# Altium schematic symbol library jlcpcb_2025_04_inductors_extended_0805.schlib: 882 symbols (part 5 of 5) (continued)
## VHF201209H2N2ST
designator L?  Inductance: 2.2nH
Inductor, 2.2nH, 100mΩ, 600mA, SMD 0805; Manufacturer: FH(Guangdong Fenghua Advanced Tech); Manufacturer Part Number: VHF201209H2N2ST; Package Size: 0805; JLCPCB Basic Part: No; JLCPCB Part Number: C1037; Supplier 1: LCSC; Category: Inductors; Supplier Part Number 1: C1037; Rated Current: 600mA; DC Resistance: 100mΩ; RoHS: Yes; ComponentLink1Description: Datasheet; ComponentLink1URL: https://wmsc.lcsc.com/wmsc/upload/file/pdf/v2/lcsc/2302231101_FH--Guangdong-Fenghua-Advanced-Tech-VHF201209H2N2ST_C1037.pdf; ComponentLink2Description: JLCPCB Part URL; ComponentLink2URL: https://jlcpcb.com/partdetail/C1037; ComponentLink3Description: LCSC Part URL; ComponentLink3URL: https://lcsc.com/product-detail/Inductors-SMD_FH-Guangdong-Fenghua-Advanced-Tech-FH-Guangdong-Fenghua-Advanced-Tech-VHF201209H2N2ST_C1037.html
footprint IND-0805 (0805 (2012M) Inductor)
pins: 1, 2

## VHF201209H2N7S
designator L?  Inductance: 2.7nH
Inductor, 2.7nH, 100mΩ, 600mA, SMD 0805; Manufacturer: FH(Guangdong Fenghua Advanced Tech); Manufacturer Part Number: VHF201209H2N7S; Package Size: 0805; JLCPCB Basic Part: No; JLCPCB Part Number: C98981; Supplier 1: LCSC; Category: Inductors; Supplier Part Number 1: C98981; Rated Current: 600mA; DC Resistance: 100mΩ; RoHS: Yes; ComponentLink1Description: Datasheet; ComponentLink1URL: https://wmsc.lcsc.com/wmsc/upload/file/pdf/v2/lcsc/2304140030_FH--Guangdong-Fenghua-Advanced-Tech-VHF201209H2N7S_C98981.pdf; ComponentLink2Description: JLCPCB Part URL; ComponentLink2URL: https://jlcpcb.com/partdetail/C98981; ComponentLink3Description: LCSC Part URL; ComponentLink3URL: https://lcsc.com/product-detail/Inductors-SMD_FH-Guangdong-Fenghua-Advanced-Tech-FH-Guangdong-Fenghua-Advanced-Tech-VHF201209H2N7S_C98981.html
footprint IND-0805 (0805 (2012M) Inductor)
pins: 1, 2

## VHF201209H2N7ST
designator L?  Inductance: 2.7nH
Inductor, 2.7nH, 100mΩ, 600mA, SMD 0805; Manufacturer: FH(Guangdong Fenghua Advanced Tech); Manufacturer Part Number: VHF201209H2N7ST; Package Size: 0805; JLCPCB Basic Part: No; JLCPCB Part Number: C381905; Supplier 1: LCSC; Category: Inductors; Supplier Part Number 1: C381905; Rated Current: 600mA; DC Resistance: 100mΩ; RoHS: Yes; ComponentLink1Description: Datasheet; ComponentLink1URL: https://wmsc.lcsc.com/wmsc/upload/file/pdf/v2/lcsc/2302231208_FH--Guangdong-Fenghua-Advanced-Tech-VHF201209H2N7ST_C381905.pdf; ComponentLink2Description: JLCPCB Part URL; ComponentLink2URL: https://jlcpcb.com/partdetail/C381905; ComponentLink3Description: LCSC Part URL; ComponentLink3URL: https://lcsc.com/product-detail/Inductors-SMD_FH-Guangdong-Fenghua-Advanced-Tech-FH-Guangdong-Fenghua-Advanced-Tech-VHF201209H2N7ST_C381905.html
footprint IND-0805 (0805 (2012M) Inductor)
pins: 1, 2

## VHF201209H3N3ST
designator L?  Inductance: 3.3nH
Inductor, 3.3nH, 130mΩ, 600mA, SMD 0805; Manufacturer: FH(Guangdong Fenghua Advanced Tech); Manufacturer Part Number: VHF201209H3N3ST; Package Size: 0805; JLCPCB Basic Part: No; JLCPCB Part Number: C98982; Supplier 1: LCSC; Category: Inductors; Supplier Part Number 1: C98982; Rated Current: 600mA; DC Resistance: 130mΩ; RoHS: Yes; ComponentLink1Description: Datasheet; ComponentLink1URL: https://wmsc.lcsc.com/wmsc/upload/file/pdf/v2/lcsc/2302231230_FH--Guangdong-Fenghua-Advanced-Tech-VHF201209H3N3ST_C98982.pdf; ComponentLink2Description: JLCPCB Part URL; ComponentLink2URL: https://jlcpcb.com/partdetail/C98982; ComponentLink3Description: LCSC Part URL; ComponentLink3URL: https://lcsc.com/product-detail/Inductors-SMD_FH-Guangdong-Fenghua-Advanced-Tech-FH-Guangdong-Fenghua-Advanced-Tech-VHF201209H3N3ST_C98982.html
footprint IND-0805 (0805 (2012M) Inductor)
pins: 1, 2

## VHF201209H3N9ST
designator L?  Inductance: 3.9nH
Inductor, 3.9nH, 150mΩ, 600mA, SMD 0805; Manufacturer: FH(Guangdong Fenghua Advanced Tech); Manufacturer Part Number: VHF201209H3N9ST; Package Size: 0805; JLCPCB Basic Part: No; JLCPCB Part Number: C381907; Supplier 1: LCSC; Category: Inductors; Supplier Part Number 1: C381907; Rated Current: 600mA; DC Resistance: 150mΩ; RoHS: Yes; ComponentLink1Description: Datasheet; ComponentLink1URL: https://wmsc.lcsc.com/wmsc/upload/file/pdf/v2/lcsc/2302231208_FH--Guangdong-Fenghua-Advanced-Tech-VHF201209H3N9ST_C381907.pdf; ComponentLink2Description: JLCPCB Part URL; ComponentLink2URL: https://jlcpcb.com/partdetail/C381907; ComponentLink3Description: LCSC Part URL; ComponentLink3URL: https://lcsc.com/product-detail/Inductors-SMD_FH-Guangdong-Fenghua-Advanced-Tech-FH-Guangdong-Fenghua-Advanced-Tech-VHF201209H3N9ST_C381907.html
footprint IND-0805 (0805 (2012M) Inductor)
pins: 1, 2

## VHF201209H4N7ST
designator L?  Inductance: 4.7nH
Inductor, 4.7nH, 200mΩ, 400mA, SMD 0805; Manufacturer: FH(Guangdong Fenghua Advanced Tech); Manufacturer Part Number: VHF201209H4N7ST; Package Size: 0805; JLCPCB Basic Part: No; JLCPCB Part Number: C1039; Supplier 1: LCSC; Category: Inductors; Supplier Part Number 1: C1039; Rated Current: 400mA; DC Resistance: 200mΩ; RoHS: Yes; ComponentLink1Description: Datasheet; ComponentLink1URL: https://wmsc.lcsc.com/wmsc/upload/file/pdf/v2/lcsc/2302231101_FH--Guangdong-Fenghua-Advanced-Tech-VHF201209H4N7ST_C1039.pdf; ComponentLink2Description: JLCPCB Part URL; ComponentLink2URL: https://jlcpcb.com/partdetail/C1039; ComponentLink3Description: LCSC Part URL; ComponentLink3URL: https://lcsc.com/product-detail/Inductors-SMD_FH-Guangdong-Fenghua-Advanced-Tech-FH-Guangdong-Fenghua-Advanced-Tech-VHF201209H4N7ST_C1039.html
footprint IND-0805 (0805 (2012M) Inductor)
pins: 1, 2

## VHF201209H5N1ST
designator L?  Inductance: 5.1nH
Inductor, 5.1nH, SMD 0805; Manufacturer: FH (Guangdong Fenghua Advanced Tech); Manufacturer Part Number: VHF201209H5N1ST; Package Size: 0805; JLCPCB Basic Part: No; JLCPCB Part Number: C3032775; Supplier 1: LCSC; Category: Inductors; Supplier Part Number 1: C3032775; RoHS: Yes; ComponentLink1Description: Datasheet; ComponentLink1URL: https://wmsc.lcsc.com/wmsc/upload/file/pdf/v2/lcsc/2302231130_FH--Guangdong-Fenghua-Advanced-Tech-VHF201209H5N1ST_C3032775.pdf; ComponentLink2Description: JLCPCB Part URL; ComponentLink2URL: https://jlcpcb.com/partdetail/C3032775; ComponentLink3Description: LCSC Part URL; ComponentLink3URL: https://lcsc.com/product-detail/Inductors-SMD_FH-Guangdong-Fenghua-Advanced-Tech-FH-Guangdong-Fenghua-Advanced-Tech-VHF201209H5N1ST_C3032775.html
footprint IND-0805 (0805 (2012M) Inductor)
pins: 1, 2

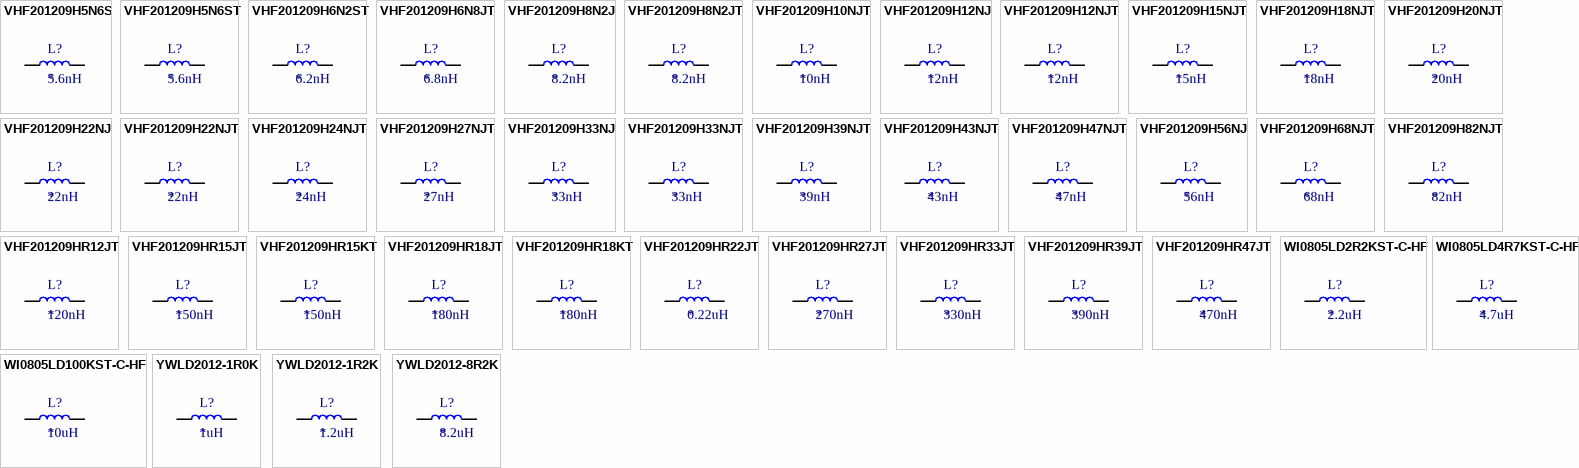
[diagram p21: symbols VHF201209H5N6S to YWLD2012-8R2K]

## VHF201209H5N6S
designator L?  Inductance: 5.6nH
Inductor, 5.6nH, 230mΩ, 400mA, SMD 0805; Manufacturer: FH(Guangdong Fenghua Advanced Tech); Manufacturer Part Number: VHF201209H5N6S; Package Size: 0805; JLCPCB Basic Part: No; JLCPCB Part Number: C98984; Supplier 1: LCSC; Category: Inductors; Supplier Part Number 1: C98984; Rated Current: 400mA; DC Resistance: 230mΩ; RoHS: Yes; ComponentLink1Description: Datasheet; ComponentLink1URL: https://wmsc.lcsc.com/wmsc/upload/file/pdf/v2/lcsc/2304140030_FH--Guangdong-Fenghua-Advanced-Tech-VHF201209H5N6S_C98984.pdf; ComponentLink2Description: JLCPCB Part URL; ComponentLink2URL: https://jlcpcb.com/partdetail/C98984; ComponentLink3Description: LCSC Part URL; ComponentLink3URL: https://lcsc.com/product-detail/Inductors-SMD_FH-Guangdong-Fenghua-Advanced-Tech-FH-Guangdong-Fenghua-Advanced-Tech-VHF201209H5N6S_C98984.html
footprint IND-0805 (0805 (2012M) Inductor)
pins: 1, 2

## VHF201209H5N6ST
designator L?  Inductance: 5.6nH
Inductor, 5.6nH, 230mΩ, 400mA, SMD 0805; Manufacturer: FH(Guangdong Fenghua Advanced Tech); Manufacturer Part Number: VHF201209H5N6ST; Package Size: 0805; JLCPCB Basic Part: No; JLCPCB Part Number: C381908; Supplier 1: LCSC; Category: Inductors; Supplier Part Number 1: C381908; Rated Current: 400mA; DC Resistance: 230mΩ; RoHS: Yes; ComponentLink1Description: Datasheet; ComponentLink1URL: https://wmsc.lcsc.com/wmsc/upload/file/pdf/v2/lcsc/2302231208_FH--Guangdong-Fenghua-Advanced-Tech-VHF201209H5N6ST_C381908.pdf; ComponentLink2Description: JLCPCB Part URL; ComponentLink2URL: https://jlcpcb.com/partdetail/C381908; ComponentLink3Description: LCSC Part URL; ComponentLink3URL: https://lcsc.com/product-detail/Inductors-SMD_FH-Guangdong-Fenghua-Advanced-Tech-FH-Guangdong-Fenghua-Advanced-Tech-VHF201209H5N6ST_C381908.html
footprint IND-0805 (0805 (2012M) Inductor)
pins: 1, 2

## VHF201209H6N2ST
designator L?  Inductance: 6.2nH
Inductor, 6.2nH, 400mA, SMD 0805; Manufacturer: FH (Guangdong Fenghua Advanced Tech); Manufacturer Part Number: VHF201209H6N2ST; Package Size: 0805; JLCPCB Basic Part: No; JLCPCB Part Number: C395101; Supplier 1: LCSC; Category: Inductors; Supplier Part Number 1: C395101; Rated Current: 400mA; RoHS: Yes; ComponentLink1Description: Datasheet; ComponentLink1URL: https://wmsc.lcsc.com/wmsc/upload/file/pdf/v2/lcsc/2302231208_FH--Guangdong-Fenghua-Advanced-Tech-VHF201209H6N2ST_C395101.pdf; ComponentLink2Description: JLCPCB Part URL; ComponentLink2URL: https://jlcpcb.com/partdetail/C395101; ComponentLink3Description: LCSC Part URL; ComponentLink3URL: https://lcsc.com/product-detail/Inductors-SMD_FH-Guangdong-Fenghua-Advanced-Tech-FH-Guangdong-Fenghua-Advanced-Tech-VHF201209H6N2ST_C395101.html
footprint IND-0805 (0805 (2012M) Inductor)
pins: 1, 2

## VHF201209H6N8JT
designator L?  Inductance: 6.8nH
Inductor, 6.8nH, ±5%, 250mΩ, 400mA, SMD 0805; Manufacturer: FH(Guangdong Fenghua Advanced Tech); Manufacturer Part Number: VHF201209H6N8JT; Package Size: 0805; JLCPCB Basic Part: No; JLCPCB Part Number: C98985; Supplier 1: LCSC; Category: Inductors; Supplier Part Number 1: C98985; Tolerance: ±5%; Rated Current: 400mA; DC Resistance: 250mΩ; RoHS: Yes; ComponentLink1Description: Datasheet; ComponentLink1URL: https://wmsc.lcsc.com/wmsc/upload/file/pdf/v2/lcsc/2302231230_FH--Guangdong-Fenghua-Advanced-Tech-VHF201209H6N8JT_C98985.pdf; ComponentLink2Description: JLCPCB Part URL; ComponentLink2URL: https://jlcpcb.com/partdetail/C98985; ComponentLink3Description: LCSC Part URL; ComponentLink3URL: https://lcsc.com/product-detail/Inductors-SMD_FH-Guangdong-Fenghua-Advanced-Tech-FH-Guangdong-Fenghua-Advanced-Tech-VHF201209H6N8JT_C98985.html
footprint IND-0805 (0805 (2012M) Inductor)
pins: 1, 2

## VHF201209H8N2J
designator L?  Inductance: 8.2nH
Inductor, 8.2nH, ±5%, 280mΩ, 400mA, SMD 0805; Manufacturer: FH(Guangdong Fenghua Advanced Tech); Manufacturer Part Number: VHF201209H8N2J; Package Size: 0805; JLCPCB Basic Part: No; JLCPCB Part Number: C98986; Supplier 1: LCSC; Category: Inductors; Supplier Part Number 1: C98986; Tolerance: ±5%; Rated Current: 400mA; DC Resistance: 280mΩ; RoHS: Yes; ComponentLink1Description: Datasheet; ComponentLink1URL: https://wmsc.lcsc.com/wmsc/upload/file/pdf/v2/lcsc/2304140030_FH--Guangdong-Fenghua-Advanced-Tech-VHF201209H8N2J_C98986.pdf; ComponentLink2Description: JLCPCB Part URL; ComponentLink2URL: https://jlcpcb.com/partdetail/C98986; ComponentLink3Description: LCSC Part URL; ComponentLink3URL: https://lcsc.com/product-detail/Inductors-SMD_FH-Guangdong-Fenghua-Advanced-Tech-FH-Guangdong-Fenghua-Advanced-Tech-VHF201209H8N2J_C98986.html
footprint IND-0805 (0805 (2012M) Inductor)
pins: 1, 2

## VHF201209H8N2JT
designator L?  Inductance: 8.2nH
Inductor, 8.2nH, ±5%, 280mΩ, 400mA, SMD 0805; Manufacturer: FH(Guangdong Fenghua Advanced Tech); Manufacturer Part Number: VHF201209H8N2JT; Package Size: 0805; JLCPCB Basic Part: No; JLCPCB Part Number: C1041; Supplier 1: LCSC; Category: Inductors; Supplier Part Number 1: C1041; Tolerance: ±5%; Rated Current: 400mA; DC Resistance: 280mΩ; RoHS: Yes; ComponentLink1Description: Datasheet; ComponentLink1URL: https://wmsc.lcsc.com/wmsc/upload/file/pdf/v2/lcsc/2302231101_FH--Guangdong-Fenghua-Advanced-Tech-VHF201209H8N2JT_C1041.pdf; ComponentLink2Description: JLCPCB Part URL; ComponentLink2URL: https://jlcpcb.com/partdetail/C1041; ComponentLink3Description: LCSC Part URL; ComponentLink3URL: https://lcsc.com/product-detail/Inductors-SMD_FH-Guangdong-Fenghua-Advanced-Tech-FH-Guangdong-Fenghua-Advanced-Tech-VHF201209H8N2JT_C1041.html
footprint IND-0805 (0805 (2012M) Inductor)
pins: 1, 2

## VHF201209H10NJT
designator L?  Inductance: 10nH
Inductor, 10nH, ±5%, 300mΩ, 300mA, SMD 0805; Manufacturer: FH(Guangdong Fenghua Advanced Tech); Manufacturer Part Number: VHF201209H10NJT; Package Size: 0805; JLCPCB Basic Part: No; JLCPCB Part Number: C98987; Supplier 1: LCSC; Category: Inductors; Supplier Part Number 1: C98987; Tolerance: ±5%; Rated Current: 300mA; DC Resistance: 300mΩ; RoHS: Yes; ComponentLink1Description: Datasheet; ComponentLink1URL: https://wmsc.lcsc.com/wmsc/upload/file/pdf/v2/lcsc/2302231230_FH--Guangdong-Fenghua-Advanced-Tech-VHF201209H10NJT_C98987.pdf; ComponentLink2Description: JLCPCB Part URL; ComponentLink2URL: https://jlcpcb.com/partdetail/C98987; ComponentLink3Description: LCSC Part URL; ComponentLink3URL: https://lcsc.com/product-detail/Inductors-SMD_FH-Guangdong-Fenghua-Advanced-Tech-FH-Guangdong-Fenghua-Advanced-Tech-VHF201209H10NJT_C98987.html
footprint IND-0805 (0805 (2012M) Inductor)
pins: 1, 2

## VHF201209H12NJ
designator L?  Inductance: 12nH
Inductor, 12nH, ±5%, 350mΩ, 300mA, SMD 0805; Manufacturer: FH(Guangdong Fenghua Advanced Tech); Manufacturer Part Number: VHF201209H12NJ; Package Size: 0805; JLCPCB Basic Part: No; JLCPCB Part Number: C98988; Supplier 1: LCSC; Category: Inductors; Supplier Part Number 1: C98988; Tolerance: ±5%; Rated Current: 300mA; DC Resistance: 350mΩ; RoHS: Yes; ComponentLink1Description: Datasheet; ComponentLink1URL: https://wmsc.lcsc.com/wmsc/upload/file/pdf/v2/lcsc/2304140030_FH--Guangdong-Fenghua-Advanced-Tech-VHF201209H12NJ_C98988.pdf; ComponentLink2Description: JLCPCB Part URL; ComponentLink2URL: https://jlcpcb.com/partdetail/C98988; ComponentLink3Description: LCSC Part URL; ComponentLink3URL: https://lcsc.com/product-detail/Inductors-SMD_FH-Guangdong-Fenghua-Advanced-Tech-FH-Guangdong-Fenghua-Advanced-Tech-VHF201209H12NJ_C98988.html
footprint IND-0805 (0805 (2012M) Inductor)
pins: 1, 2

## VHF201209H12NJT
designator L?  Inductance: 12nH
Inductor, 12nH, ±5%, 350mΩ, 300mA, SMD 0805; Manufacturer: FH(Guangdong Fenghua Advanced Tech); Manufacturer Part Number: VHF201209H12NJT; Package Size: 0805; JLCPCB Basic Part: No; JLCPCB Part Number: C75651; Supplier 1: LCSC; Category: Inductors; Supplier Part Number 1: C75651; Tolerance: ±5%; Rated Current: 300mA; DC Resistance: 350mΩ; RoHS: Yes; ComponentLink1Description: Datasheet; ComponentLink1URL: https://wmsc.lcsc.com/wmsc/upload/file/pdf/v2/lcsc/2302231101_FH--Guangdong-Fenghua-Advanced-Tech-VHF201209H12NJT_C75651.pdf; ComponentLink2Description: JLCPCB Part URL; ComponentLink2URL: https://jlcpcb.com/partdetail/C75651; ComponentLink3Description: LCSC Part URL; ComponentLink3URL: https://lcsc.com/product-detail/Inductors-SMD_FH-Guangdong-Fenghua-Advanced-Tech-FH-Guangdong-Fenghua-Advanced-Tech-VHF201209H12NJT_C75651.html
footprint IND-0805 (0805 (2012M) Inductor)
pins: 1, 2

## VHF201209H15NJT
designator L?  Inductance: 15nH
Inductor, 15nH, ±5%, 400mΩ, 300mA, SMD 0805; Manufacturer: FH(Guangdong Fenghua Advanced Tech); Manufacturer Part Number: VHF201209H15NJT; Package Size: 0805; JLCPCB Basic Part: No; JLCPCB Part Number: C139275; Supplier 1: LCSC; Category: Inductors; Supplier Part Number 1: C139275; Tolerance: ±5%; Rated Current: 300mA; DC Resistance: 400mΩ; RoHS: Yes; ComponentLink1Description: Datasheet; ComponentLink1URL: https://wmsc.lcsc.com/wmsc/upload/file/pdf/v2/lcsc/2302231230_FH--Guangdong-Fenghua-Advanced-Tech-VHF201209H15NJT_C139275.pdf; ComponentLink2Description: JLCPCB Part URL; ComponentLink2URL: https://jlcpcb.com/partdetail/C139275; ComponentLink3Description: LCSC Part URL; ComponentLink3URL: https://lcsc.com/product-detail/Inductors-SMD_FH-Guangdong-Fenghua-Advanced-Tech-FH-Guangdong-Fenghua-Advanced-Tech-VHF201209H15NJT_C139275.html
footprint IND-0805 (0805 (2012M) Inductor)
pins: 1, 2

## VHF201209H18NJT
designator L?  Inductance: 18nH
Inductor, 18nH, ±5%, 450mΩ, 300mA, SMD 0805; Manufacturer: FH(Guangdong Fenghua Advanced Tech); Manufacturer Part Number: VHF201209H18NJT; Package Size: 0805; JLCPCB Basic Part: No; JLCPCB Part Number: C98990; Supplier 1: LCSC; Category: Inductors; Supplier Part Number 1: C98990; Tolerance: ±5%; Rated Current: 300mA; DC Resistance: 450mΩ; RoHS: Yes; ComponentLink1Description: Datasheet; ComponentLink1URL: https://wmsc.lcsc.com/wmsc/upload/file/pdf/v2/lcsc/2302231230_FH--Guangdong-Fenghua-Advanced-Tech-VHF201209H18NJT_C98990.pdf; ComponentLink2Description: JLCPCB Part URL; ComponentLink2URL: https://jlcpcb.com/partdetail/C98990; ComponentLink3Description: LCSC Part URL; ComponentLink3URL: https://lcsc.com/product-detail/Inductors-SMD_FH-Guangdong-Fenghua-Advanced-Tech-FH-Guangdong-Fenghua-Advanced-Tech-VHF201209H18NJT_C98990.html
footprint IND-0805 (0805 (2012M) Inductor)
pins: 1, 2

## VHF201209H20NJT
designator L?  Inductance: 20nH
Inductor, 20nH, ±5%, SMD 0805; Manufacturer: FH (Guangdong Fenghua Advanced Tech); Manufacturer Part Number: VHF201209H20NJT; Package Size: 0805; JLCPCB Basic Part: No; JLCPCB Part Number: C395098; Supplier 1: LCSC; Category: Inductors; Supplier Part Number 1: C395098; Tolerance: ±5%; RoHS: Yes; ComponentLink1Description: Datasheet; ComponentLink1URL: https://wmsc.lcsc.com/wmsc/upload/file/pdf/v2/lcsc/2302231208_FH--Guangdong-Fenghua-Advanced-Tech-VHF201209H20NJT_C395098.pdf; ComponentLink2Description: JLCPCB Part URL; ComponentLink2URL: https://jlcpcb.com/partdetail/C395098; ComponentLink3Description: LCSC Part URL; ComponentLink3URL: https://lcsc.com/product-detail/Inductors-SMD_FH-Guangdong-Fenghua-Advanced-Tech-FH-Guangdong-Fenghua-Advanced-Tech-VHF201209H20NJT_C395098.html
footprint IND-0805 (0805 (2012M) Inductor)
pins: 1, 2

## VHF201209H22NJ
designator L?  Inductance: 22nH
Inductor, 22nH, ±5%, 500mΩ, 300mA, SMD 0805; Manufacturer: FH(Guangdong Fenghua Advanced Tech); Manufacturer Part Number: VHF201209H22NJ; Package Size: 0805; JLCPCB Basic Part: No; JLCPCB Part Number: C98991; Supplier 1: LCSC; Category: Inductors; Supplier Part Number 1: C98991; Tolerance: ±5%; Rated Current: 300mA; DC Resistance: 500mΩ; RoHS: Yes; ComponentLink1Description: Datasheet; ComponentLink1URL: https://wmsc.lcsc.com/wmsc/upload/file/pdf/v2/lcsc/2304140030_FH--Guangdong-Fenghua-Advanced-Tech-VHF201209H22NJ_C98991.pdf; ComponentLink2Description: JLCPCB Part URL; ComponentLink2URL: https://jlcpcb.com/partdetail/C98991; ComponentLink3Description: LCSC Part URL; ComponentLink3URL: https://lcsc.com/product-detail/Inductors-SMD_FH-Guangdong-Fenghua-Advanced-Tech-FH-Guangdong-Fenghua-Advanced-Tech-VHF201209H22NJ_C98991.html
footprint IND-0805 (0805 (2012M) Inductor)
pins: 1, 2

## VHF201209H22NJT
designator L?  Inductance: 22nH
Inductor, 22nH, ±5%, 500mΩ, 300mA, SMD 0805; Manufacturer: FH(Guangdong Fenghua Advanced Tech); Manufacturer Part Number: VHF201209H22NJT; Package Size: 0805; JLCPCB Basic Part: No; JLCPCB Part Number: C139277; Supplier 1: LCSC; Category: Inductors; Supplier Part Number 1: C139277; Tolerance: ±5%; Rated Current: 300mA; DC Resistance: 500mΩ; RoHS: Yes; ComponentLink1Description: Datasheet; ComponentLink1URL: https://wmsc.lcsc.com/wmsc/upload/file/pdf/v2/lcsc/2302231230_FH--Guangdong-Fenghua-Advanced-Tech-VHF201209H22NJT_C139277.pdf; ComponentLink2Description: JLCPCB Part URL; ComponentLink2URL: https://jlcpcb.com/partdetail/C139277; ComponentLink3Description: LCSC Part URL; ComponentLink3URL: https://lcsc.com/product-detail/Inductors-SMD_FH-Guangdong-Fenghua-Advanced-Tech-FH-Guangdong-Fenghua-Advanced-Tech-VHF201209H22NJT_C139277.html
footprint IND-0805 (0805 (2012M) Inductor)
pins: 1, 2

## VHF201209H24NJT
designator L?  Inductance: 24nH
Inductor, 24nH, ±5%, SMD 0805; Manufacturer: FH(Guangdong Fenghua Advanced Tech); Manufacturer Part Number: VHF201209H24NJT; Package Size: 0805; JLCPCB Basic Part: No; JLCPCB Part Number: C395099; Supplier 1: LCSC; Category: Inductors; Supplier Part Number 1: C395099; Tolerance: ±5%; RoHS: Yes; ComponentLink1Description: Datasheet; ComponentLink1URL: https://wmsc.lcsc.com/wmsc/upload/file/pdf/v2/lcsc/2302231208_FH--Guangdong-Fenghua-Advanced-Tech-VHF201209H24NJT_C395099.pdf; ComponentLink2Description: JLCPCB Part URL; ComponentLink2URL: https://jlcpcb.com/partdetail/C395099; ComponentLink3Description: LCSC Part URL; ComponentLink3URL: https://lcsc.com/product-detail/Inductors-SMD_FH-Guangdong-Fenghua-Advanced-Tech-FH-Guangdong-Fenghua-Advanced-Tech-VHF201209H24NJT_C395099.html
footprint IND-0805 (0805 (2012M) Inductor)
pins: 1, 2

## VHF201209H27NJT
designator L?  Inductance: 27nH
Inductor, 27nH, ±5%, 550mΩ, 300mA, SMD 0805; Manufacturer: FH(Guangdong Fenghua Advanced Tech); Manufacturer Part Number: VHF201209H27NJT; Package Size: 0805; JLCPCB Basic Part: No; JLCPCB Part Number: C98992; Supplier 1: LCSC; Category: Inductors; Supplier Part Number 1: C98992; Tolerance: ±5%; Rated Current: 300mA; DC Resistance: 550mΩ; RoHS: Yes; ComponentLink1Description: Datasheet; ComponentLink1URL: https://wmsc.lcsc.com/wmsc/upload/file/pdf/v2/lcsc/2302231230_FH--Guangdong-Fenghua-Advanced-Tech-VHF201209H27NJT_C98992.pdf; ComponentLink2Description: JLCPCB Part URL; ComponentLink2URL: https://jlcpcb.com/partdetail/C98992; ComponentLink3Description: LCSC Part URL; ComponentLink3URL: https://lcsc.com/product-detail/Inductors-SMD_FH-Guangdong-Fenghua-Advanced-Tech-FH-Guangdong-Fenghua-Advanced-Tech-VHF201209H27NJT_C98992.html
footprint IND-0805 (0805 (2012M) Inductor)
pins: 1, 2

## VHF201209H33NJ
designator L?  Inductance: 33nH
Inductor, 33nH, ±5%, 600mΩ, 300mA, SMD 0805; Manufacturer: FH(Guangdong Fenghua Advanced Tech); Manufacturer Part Number: VHF201209H33NJ; Package Size: 0805; JLCPCB Basic Part: No; JLCPCB Part Number: C98993; Supplier 1: LCSC; Category: Inductors; Supplier Part Number 1: C98993; Tolerance: ±5%; Rated Current: 300mA; DC Resistance: 600mΩ; RoHS: Yes; ComponentLink1Description: Datasheet; ComponentLink1URL: https://wmsc.lcsc.com/wmsc/upload/file/pdf/v2/lcsc/2304140030_FH--Guangdong-Fenghua-Advanced-Tech-VHF201209H33NJ_C98993.pdf; ComponentLink2Description: JLCPCB Part URL; ComponentLink2URL: https://jlcpcb.com/partdetail/C98993; ComponentLink3Description: LCSC Part URL; ComponentLink3URL: https://lcsc.com/product-detail/Inductors-SMD_FH-Guangdong-Fenghua-Advanced-Tech-FH-Guangdong-Fenghua-Advanced-Tech-VHF201209H33NJ_C98993.html
footprint IND-0805 (0805 (2012M) Inductor)
pins: 1, 2

## VHF201209H33NJT
designator L?  Inductance: 33nH
Inductor, 33nH, ±5%, 600mΩ, 300mA, SMD 0805; Manufacturer: FH(Guangdong Fenghua Advanced Tech); Manufacturer Part Number: VHF201209H33NJT; Package Size: 0805; JLCPCB Basic Part: No; JLCPCB Part Number: C46432; Supplier 1: LCSC; Category: Inductors; Supplier Part Number 1: C46432; Tolerance: ±5%; Rated Current: 300mA; DC Resistance: 600mΩ; RoHS: Yes; ComponentLink1Description: Datasheet; ComponentLink1URL: https://wmsc.lcsc.com/wmsc/upload/file/pdf/v2/lcsc/2302231300_FH--Guangdong-Fenghua-Advanced-Tech-VHF201209H33NJT_C46432.pdf; ComponentLink2Description: JLCPCB Part URL; ComponentLink2URL: https://jlcpcb.com/partdetail/C46432; ComponentLink3Description: LCSC Part URL; ComponentLink3URL: https://lcsc.com/product-detail/Inductors-SMD_FH-Guangdong-Fenghua-Advanced-Tech-FH-Guangdong-Fenghua-Advanced-Tech-VHF201209H33NJT_C46432.html
footprint IND-0805 (0805 (2012M) Inductor)
pins: 1, 2

## VHF201209H39NJT
designator L?  Inductance: 39nH
Inductor, 39nH, ±5%, 700mΩ, 300mA, SMD 0805; Manufacturer: FH(Guangdong Fenghua Advanced Tech); Manufacturer Part Number: VHF201209H39NJT; Package Size: 0805; JLCPCB Basic Part: No; JLCPCB Part Number: C98994; Supplier 1: LCSC; Category: Inductors; Supplier Part Number 1: C98994; Tolerance: ±5%; Rated Current: 300mA; DC Resistance: 700mΩ; RoHS: Yes; ComponentLink1Description: Datasheet; ComponentLink1URL: https://wmsc.lcsc.com/wmsc/upload/file/pdf/v2/lcsc/2302231230_FH--Guangdong-Fenghua-Advanced-Tech-VHF201209H39NJT_C98994.pdf; ComponentLink2Description: JLCPCB Part URL; ComponentLink2URL: https://jlcpcb.com/partdetail/C98994; ComponentLink3Description: LCSC Part URL; ComponentLink3URL: https://lcsc.com/product-detail/Inductors-SMD_FH-Guangdong-Fenghua-Advanced-Tech-FH-Guangdong-Fenghua-Advanced-Tech-VHF201209H39NJT_C98994.html
footprint IND-0805 (0805 (2012M) Inductor)
pins: 1, 2

## VHF201209H43NJT
designator L?  Inductance: 43nH
Inductor, 43nH, ±5%, SMD 0805; Manufacturer: FH (Guangdong Fenghua Advanced Tech); Manufacturer Part Number: VHF201209H43NJT; Package Size: 0805; JLCPCB Basic Part: No; JLCPCB Part Number: C3032701; Supplier 1: LCSC; Category: Inductors; Supplier Part Number 1: C3032701; Tolerance: ±5%; RoHS: Yes; ComponentLink1Description: Datasheet; ComponentLink1URL: https://wmsc.lcsc.com/wmsc/upload/file/pdf/v2/lcsc/2302231130_FH--Guangdong-Fenghua-Advanced-Tech-VHF201209H43NJT_C3032701.pdf; ComponentLink2Description: JLCPCB Part URL; ComponentLink2URL: https://jlcpcb.com/partdetail/C3032701; ComponentLink3Description: LCSC Part URL; ComponentLink3URL: https://lcsc.com/product-detail/Inductors-SMD_FH-Guangdong-Fenghua-Advanced-Tech-FH-Guangdong-Fenghua-Advanced-Tech-VHF201209H43NJT_C3032701.html
footprint IND-0805 (0805 (2012M) Inductor)
pins: 1, 2

## VHF201209H47NJT
designator L?  Inductance: 47nH
Inductor, 47nH, ±5%, 800mΩ, 300mA, SMD 0805; Manufacturer: FH(Guangdong Fenghua Advanced Tech); Manufacturer Part Number: VHF201209H47NJT; Package Size: 0805; JLCPCB Basic Part: No; JLCPCB Part Number: C46431; Supplier 1: LCSC; Category: Inductors; Supplier Part Number 1: C46431; Tolerance: ±5%; Rated Current: 300mA; DC Resistance: 800mΩ; RoHS: Yes; ComponentLink1Description: Datasheet; ComponentLink1URL: https://wmsc.lcsc.com/wmsc/upload/file/pdf/v2/lcsc/2302231300_FH--Guangdong-Fenghua-Advanced-Tech-VHF201209H47NJT_C46431.pdf; ComponentLink2Description: JLCPCB Part URL; ComponentLink2URL: https://jlcpcb.com/partdetail/C46431; ComponentLink3Description: LCSC Part URL; ComponentLink3URL: https://lcsc.com/product-detail/Inductors-SMD_FH-Guangdong-Fenghua-Advanced-Tech-FH-Guangdong-Fenghua-Advanced-Tech-VHF201209H47NJT_C46431.html
footprint IND-0805 (0805 (2012M) Inductor)
pins: 1, 2

## VHF201209H56NJ
designator L?  Inductance: 56nH
Inductor, 56nH, ±5%, 800mΩ, 300mA, SMD 0805; Manufacturer: FH(Guangdong Fenghua Advanced Tech); Manufacturer Part Number: VHF201209H56NJ; Package Size: 0805; JLCPCB Basic Part: No; JLCPCB Part Number: C98996; Supplier 1: LCSC; Category: Inductors; Supplier Part Number 1: C98996; Tolerance: ±5%; Rated Current: 300mA; DC Resistance: 800mΩ; RoHS: Yes; ComponentLink1Description: Datasheet; ComponentLink1URL: https://wmsc.lcsc.com/wmsc/upload/file/pdf/v2/lcsc/2304140030_FH--Guangdong-Fenghua-Advanced-Tech-VHF201209H56NJ_C98996.pdf; ComponentLink2Description: JLCPCB Part URL; ComponentLink2URL: https://jlcpcb.com/partdetail/C98996; ComponentLink3Description: LCSC Part URL; ComponentLink3URL: https://lcsc.com/product-detail/Inductors-SMD_FH-Guangdong-Fenghua-Advanced-Tech-FH-Guangdong-Fenghua-Advanced-Tech-VHF201209H56NJ_C98996.html
footprint IND-0805 (0805 (2012M) Inductor)
pins: 1, 2

## VHF201209H68NJT
designator L?  Inductance: 68nH
Inductor, 68nH, ±5%, 850mΩ, 300mA, SMD 0805; Manufacturer: FH(Guangdong Fenghua Advanced Tech); Manufacturer Part Number: VHF201209H68NJT; Package Size: 0805; JLCPCB Basic Part: No; JLCPCB Part Number: C75652; Supplier 1: LCSC; Category: Inductors; Supplier Part Number 1: C75652; Tolerance: ±5%; Rated Current: 300mA; DC Resistance: 850mΩ; RoHS: Yes; ComponentLink1Description: Datasheet; ComponentLink1URL: https://wmsc.lcsc.com/wmsc/upload/file/pdf/v2/lcsc/2302231101_FH--Guangdong-Fenghua-Advanced-Tech-VHF201209H68NJT_C75652.pdf; ComponentLink2Description: JLCPCB Part URL; ComponentLink2URL: https://jlcpcb.com/partdetail/C75652; ComponentLink3Description: LCSC Part URL; ComponentLink3URL: https://lcsc.com/product-detail/Inductors-SMD_FH-Guangdong-Fenghua-Advanced-Tech-FH-Guangdong-Fenghua-Advanced-Tech-VHF201209H68NJT_C75652.html
footprint IND-0805 (0805 (2012M) Inductor)
pins: 1, 2

## VHF201209H82NJT
designator L?  Inductance: 82nH
Inductor, 82nH, ±5%, 900mΩ, 300mA, SMD 0805; Manufacturer: FH(Guangdong Fenghua Advanced Tech); Manufacturer Part Number: VHF201209H82NJT; Package Size: 0805; JLCPCB Basic Part: No; JLCPCB Part Number: C139279; Supplier 1: LCSC; Category: Inductors; Supplier Part Number 1: C139279; Tolerance: ±5%; Rated Current: 300mA; DC Resistance: 900mΩ; RoHS: Yes; ComponentLink1Description: Datasheet; ComponentLink1URL: https://wmsc.lcsc.com/wmsc/upload/file/pdf/v2/lcsc/2302231230_FH--Guangdong-Fenghua-Advanced-Tech-VHF201209H82NJT_C139279.pdf; ComponentLink2Description: JLCPCB Part URL; ComponentLink2URL: https://jlcpcb.com/partdetail/C139279; ComponentLink3Description: LCSC Part URL; ComponentLink3URL: https://lcsc.com/product-detail/Inductors-SMD_FH-Guangdong-Fenghua-Advanced-Tech-FH-Guangdong-Fenghua-Advanced-Tech-VHF201209H82NJT_C139279.html
footprint IND-0805 (0805 (2012M) Inductor)
pins: 1, 2

## VHF201209HR12JT
designator L?  Inductance: 120nH
Inductor, 120nH, ±5%, 1.2Ω, 300mA, SMD 0805; Manufacturer: FH(Guangdong Fenghua Advanced Tech); Manufacturer Part Number: VHF201209HR12JT; Package Size: 0805; JLCPCB Basic Part: No; JLCPCB Part Number: C46435; Supplier 1: LCSC; Category: Inductors; Supplier Part Number 1: C46435; Tolerance: ±5%; Rated Current: 300mA; DC Resistance: 1.2Ω; RoHS: Yes; ComponentLink1Description: Datasheet; ComponentLink1URL: https://wmsc.lcsc.com/wmsc/upload/file/pdf/v2/lcsc/2302231300_FH--Guangdong-Fenghua-Advanced-Tech-VHF201209HR12JT_C46435.pdf; ComponentLink2Description: JLCPCB Part URL; ComponentLink2URL: https://jlcpcb.com/partdetail/C46435; ComponentLink3Description: LCSC Part URL; ComponentLink3URL: https://lcsc.com/product-detail/Inductors-SMD_FH-Guangdong-Fenghua-Advanced-Tech-FH-Guangdong-Fenghua-Advanced-Tech-VHF201209HR12JT_C46435.html
footprint IND-0805 (0805 (2012M) Inductor)
pins: 1, 2

## VHF201209HR15JT
designator L?  Inductance: 150nH
Inductor, 150nH, ±5%, 1.5Ω, 300mA, SMD 0805; Manufacturer: FH(Guangdong Fenghua Advanced Tech); Manufacturer Part Number: VHF201209HR15JT; Package Size: 0805; JLCPCB Basic Part: No; JLCPCB Part Number: C139280; Supplier 1: LCSC; Category: Inductors; Supplier Part Number 1: C139280; Tolerance: ±5%; Rated Current: 300mA; DC Resistance: 1.5Ω; RoHS: Yes; ComponentLink1Description: Datasheet; ComponentLink1URL: https://wmsc.lcsc.com/wmsc/upload/file/pdf/v2/lcsc/2302231230_FH--Guangdong-Fenghua-Advanced-Tech-VHF201209HR15JT_C139280.pdf; ComponentLink2Description: JLCPCB Part URL; ComponentLink2URL: https://jlcpcb.com/partdetail/C139280; ComponentLink3Description: LCSC Part URL; ComponentLink3URL: https://lcsc.com/product-detail/Inductors-SMD_FH-Guangdong-Fenghua-Advanced-Tech-FH-Guangdong-Fenghua-Advanced-Tech-VHF201209HR15JT_C139280.html
footprint IND-0805 (0805 (2012M) Inductor)
pins: 1, 2

## VHF201209HR15KT
designator L?  Inductance: 150nH
Inductor, 150nH, ±10%, 1.5Ω, 300mA, SMD 0805; Manufacturer: FH(Guangdong Fenghua Advanced Tech); Manufacturer Part Number: VHF201209HR15KT; Package Size: 0805; JLCPCB Basic Part: No; JLCPCB Part Number: C381910; Supplier 1: LCSC; Category: Inductors; Supplier Part Number 1: C381910; Tolerance: ±10%; Rated Current: 300mA; DC Resistance: 1.5Ω; RoHS: Yes; ComponentLink1Description: Datasheet; ComponentLink1URL: https://wmsc.lcsc.com/wmsc/upload/file/pdf/v2/lcsc/2302231208_FH--Guangdong-Fenghua-Advanced-Tech-VHF201209HR15KT_C381910.pdf; ComponentLink2Description: JLCPCB Part URL; ComponentLink2URL: https://jlcpcb.com/partdetail/C381910; ComponentLink3Description: LCSC Part URL; ComponentLink3URL: https://lcsc.com/product-detail/Inductors-SMD_FH-Guangdong-Fenghua-Advanced-Tech-FH-Guangdong-Fenghua-Advanced-Tech-VHF201209HR15KT_C381910.html
footprint IND-0805 (0805 (2012M) Inductor)
pins: 1, 2

## VHF201209HR18JT
designator L?  Inductance: 180nH
Inductor, 180nH, ±5%, 1.8Ω, 300mA, SMD 0805; Manufacturer: FH(Guangdong Fenghua Advanced Tech); Manufacturer Part Number: VHF201209HR18JT; Package Size: 0805; JLCPCB Basic Part: No; JLCPCB Part Number: C99002; Supplier 1: LCSC; Category: Inductors; Supplier Part Number 1: C99002; Tolerance: ±5%; Rated Current: 300mA; DC Resistance: 1.8Ω; RoHS: Yes; ComponentLink1Description: Datasheet; ComponentLink1URL: https://wmsc.lcsc.com/wmsc/upload/file/pdf/v2/lcsc/2302231230_FH--Guangdong-Fenghua-Advanced-Tech-VHF201209HR18JT_C99002.pdf; ComponentLink2Description: JLCPCB Part URL; ComponentLink2URL: https://jlcpcb.com/partdetail/C99002; ComponentLink3Description: LCSC Part URL; ComponentLink3URL: https://lcsc.com/product-detail/Inductors-SMD_FH-Guangdong-Fenghua-Advanced-Tech-FH-Guangdong-Fenghua-Advanced-Tech-VHF201209HR18JT_C99002.html
footprint IND-0805 (0805 (2012M) Inductor)
pins: 1, 2

## VHF201209HR18KT
designator L?  Inductance: 180nH
Inductor, 180nH, ±10%, 1.8Ω, 300mA, SMD 0805; Manufacturer: FH(Guangdong Fenghua Advanced Tech); Manufacturer Part Number: VHF201209HR18KT; Package Size: 0805; JLCPCB Basic Part: No; JLCPCB Part Number: C381911; Supplier 1: LCSC; Category: Inductors; Supplier Part Number 1: C381911; Tolerance: ±10%; Rated Current: 300mA; DC Resistance: 1.8Ω; RoHS: Yes; ComponentLink1Description: Datasheet; ComponentLink1URL: https://wmsc.lcsc.com/wmsc/upload/file/pdf/v2/lcsc/2302231208_FH--Guangdong-Fenghua-Advanced-Tech-VHF201209HR18KT_C381911.pdf; ComponentLink2Description: JLCPCB Part URL; ComponentLink2URL: https://jlcpcb.com/partdetail/C381911; ComponentLink3Description: LCSC Part URL; ComponentLink3URL: https://lcsc.com/product-detail/Inductors-SMD_FH-Guangdong-Fenghua-Advanced-Tech-FH-Guangdong-Fenghua-Advanced-Tech-VHF201209HR18KT_C381911.html
footprint IND-0805 (0805 (2012M) Inductor)
pins: 1, 2

## VHF201209HR22JT
designator L?  Inductance: 0.22uH
Inductor, 0.22uH, ±5%, SMD 0805; Manufacturer: FH (Guangdong Fenghua Advanced Tech); Manufacturer Part Number: VHF201209HR22JT; Package Size: 0805; JLCPCB Basic Part: No; JLCPCB Part Number: C395102; Supplier 1: LCSC; Category: Inductors; Supplier Part Number 1: C395102; Tolerance: ±5%; RoHS: Yes; ComponentLink1Description: Datasheet; ComponentLink1URL: https://wmsc.lcsc.com/wmsc/upload/file/pdf/v2/lcsc/2302231208_FH--Guangdong-Fenghua-Advanced-Tech-VHF201209HR22JT_C395102.pdf; ComponentLink2Description: JLCPCB Part URL; ComponentLink2URL: https://jlcpcb.com/partdetail/C395102; ComponentLink3Description: LCSC Part URL; ComponentLink3URL: https://lcsc.com/product-detail/Inductors-SMD_FH-Guangdong-Fenghua-Advanced-Tech-FH-Guangdong-Fenghua-Advanced-Tech-VHF201209HR22JT_C395102.html
footprint IND-0805 (0805 (2012M) Inductor)
pins: 1, 2

## VHF201209HR27JT
designator L?  Inductance: 270nH
Inductor, 270nH, ±5%, 1.8Ω, 300mA, SMD 0805; Manufacturer: FH(Guangdong Fenghua Advanced Tech); Manufacturer Part Number: VHF201209HR27JT; Package Size: 0805; JLCPCB Basic Part: No; JLCPCB Part Number: C395103; Supplier 1: LCSC; Category: Inductors; Supplier Part Number 1: C395103; Tolerance: ±5%; Rated Current: 300mA; DC Resistance: 1.8Ω; RoHS: Yes; ComponentLink1Description: Datasheet; ComponentLink1URL: https://wmsc.lcsc.com/wmsc/upload/file/pdf/v2/lcsc/2302231208_FH--Guangdong-Fenghua-Advanced-Tech-VHF201209HR27JT_C395103.pdf; ComponentLink2Description: JLCPCB Part URL; ComponentLink2URL: https://jlcpcb.com/partdetail/C395103; ComponentLink3Description: LCSC Part URL; ComponentLink3URL: https://lcsc.com/product-detail/Inductors-SMD_FH-Guangdong-Fenghua-Advanced-Tech-FH-Guangdong-Fenghua-Advanced-Tech-VHF201209HR27JT_C395103.html
footprint IND-0805 (0805 (2012M) Inductor)
pins: 1, 2

## VHF201209HR33JT
designator L?  Inductance: 330nH
Inductor, 330nH, ±5%, 2Ω, 300mA, SMD 0805; Manufacturer: FH(Guangdong Fenghua Advanced Tech); Manufacturer Part Number: VHF201209HR33JT; Package Size: 0805; JLCPCB Basic Part: No; JLCPCB Part Number: C395104; Supplier 1: LCSC; Category: Inductors; Supplier Part Number 1: C395104; Tolerance: ±5%; Rated Current: 300mA; DC Resistance: 2Ω; RoHS: Yes; ComponentLink1Description: Datasheet; ComponentLink1URL: https://wmsc.lcsc.com/wmsc/upload/file/pdf/v2/lcsc/2302231208_FH--Guangdong-Fenghua-Advanced-Tech-VHF201209HR33JT_C395104.pdf; ComponentLink2Description: JLCPCB Part URL; ComponentLink2URL: https://jlcpcb.com/partdetail/C395104; ComponentLink3Description: LCSC Part URL; ComponentLink3URL: https://lcsc.com/product-detail/Inductors-SMD_FH-Guangdong-Fenghua-Advanced-Tech-FH-Guangdong-Fenghua-Advanced-Tech-VHF201209HR33JT_C395104.html
footprint IND-0805 (0805 (2012M) Inductor)
pins: 1, 2

## VHF201209HR39JT
designator L?  Inductance: 390nH
Inductor, 390nH, ±5%, 2Ω, 300mA, SMD 0805; Manufacturer: FH(Guangdong Fenghua Advanced Tech); Manufacturer Part Number: VHF201209HR39JT; Package Size: 0805; JLCPCB Basic Part: No; JLCPCB Part Number: C395105; Supplier 1: LCSC; Category: Inductors; Supplier Part Number 1: C395105; Tolerance: ±5%; Rated Current: 300mA; DC Resistance: 2Ω; RoHS: Yes; ComponentLink1Description: Datasheet; ComponentLink1URL: https://wmsc.lcsc.com/wmsc/upload/file/pdf/v2/lcsc/2302231208_FH--Guangdong-Fenghua-Advanced-Tech-VHF201209HR39JT_C395105.pdf; ComponentLink2Description: JLCPCB Part URL; ComponentLink2URL: https://jlcpcb.com/partdetail/C395105; ComponentLink3Description: LCSC Part URL; ComponentLink3URL: https://lcsc.com/product-detail/Inductors-SMD_FH-Guangdong-Fenghua-Advanced-Tech-FH-Guangdong-Fenghua-Advanced-Tech-VHF201209HR39JT_C395105.html
footprint IND-0805 (0805 (2012M) Inductor)
pins: 1, 2

## VHF201209HR47JT
designator L?  Inductance: 470nH
Inductor, 470nH, ±5%, 2Ω, 300mA, SMD 0805; Manufacturer: FH(Guangdong Fenghua Advanced Tech); Manufacturer Part Number: VHF201209HR47JT; Package Size: 0805; JLCPCB Basic Part: No; JLCPCB Part Number: C395106; Supplier 1: LCSC; Category: Inductors; Supplier Part Number 1: C395106; Tolerance: ±5%; Rated Current: 300mA; DC Resistance: 2Ω; RoHS: Yes; ComponentLink1Description: Datasheet; ComponentLink1URL: https://wmsc.lcsc.com/wmsc/upload/file/pdf/v2/lcsc/2302231208_FH--Guangdong-Fenghua-Advanced-Tech-VHF201209HR47JT_C395106.pdf; ComponentLink2Description: JLCPCB Part URL; ComponentLink2URL: https://jlcpcb.com/partdetail/C395106; ComponentLink3Description: LCSC Part URL; ComponentLink3URL: https://lcsc.com/product-detail/Inductors-SMD_FH-Guangdong-Fenghua-Advanced-Tech-FH-Guangdong-Fenghua-Advanced-Tech-VHF201209HR47JT_C395106.html
footprint IND-0805 (0805 (2012M) Inductor)
pins: 1, 2

## WI0805LD2R2KST-C-HF
designator L?  Inductance: 2.2uH
Inductor, 2.2uH, ±10%, 312mΩ, SMD 0805; Manufacturer: DDY; Manufacturer Part Number: WI0805LD2R2KST-C-HF; Self-Resonant Frequency: 80MHz; Q Factor: 12@7.9MHz; Package Size: 0805; JLCPCB Basic Part: No; JLCPCB Part Number: C2921058; Supplier 1: LCSC; Category: Inductors; Supplier Part Number 1: C2921058; Tolerance: ±10%; DC Resistance: 312mΩ; RoHS: Yes; ComponentLink1Description: Datasheet; ComponentLink1URL: https://wmsc.lcsc.com/wmsc/upload/file/pdf/v2/lcsc/2111172030_DDY-WI0805LD2R2KST-C-HF_C2921058.pdf; ComponentLink2Description: JLCPCB Part URL; ComponentLink2URL: https://jlcpcb.com/partdetail/C2921058; ComponentLink3Description: LCSC Part URL; ComponentLink3URL: https://lcsc.com/product-detail/Inductors-SMD_DDY-DDY-WI0805LD2R2KST-C-HF_C2921058.html
footprint IND-0805 (0805 (2012M) Inductor)
pins: 1, 2

## WI0805LD4R7KST-C-HF
designator L?  Inductance: 4.7uH
Inductor, 4.7uH, ±10%, 559mΩ, SMD 0805; Manufacturer: DDY; Manufacturer Part Number: WI0805LD4R7KST-C-HF; Self-Resonant Frequency: 51MHz; Q Factor: 14@7.9MHz; Package Size: 0805; JLCPCB Basic Part: No; JLCPCB Part Number: C2921059; Supplier 1: LCSC; Category: Inductors; Supplier Part Number 1: C2921059; Tolerance: ±10%; DC Resistance: 559mΩ; RoHS: Yes; ComponentLink1Description: Datasheet; ComponentLink1URL: https://wmsc.lcsc.com/wmsc/upload/file/pdf/v2/lcsc/2111172030_DDY-WI0805LD4R7KST-C-HF_C2921059.pdf; ComponentLink2Description: JLCPCB Part URL; ComponentLink2URL: https://jlcpcb.com/partdetail/C2921059; ComponentLink3Description: LCSC Part URL; ComponentLink3URL: https://lcsc.com/product-detail/Inductors-SMD_DDY-DDY-WI0805LD4R7KST-C-HF_C2921059.html
footprint IND-0805 (0805 (2012M) Inductor)
pins: 1, 2

## WI0805LD100KST-C-HF
designator L?  Inductance: 10uH
Inductor, 10uH, ±10%, 1.17Ω, SMD 0805; Manufacturer: DDY; Manufacturer Part Number: WI0805LD100KST-C-HF; Self-Resonant Frequency: 25MHz; Q Factor: 14@2.5MHz; Package Size: 0805; JLCPCB Basic Part: No; JLCPCB Part Number: C2921060; Supplier 1: LCSC; Category: Inductors; Supplier Part Number 1: C2921060; Tolerance: ±10%; DC Resistance: 1.17Ω; RoHS: Yes; ComponentLink1Description: Datasheet; ComponentLink1URL: https://wmsc.lcsc.com/wmsc/upload/file/pdf/v2/lcsc/2111172030_DDY-WI0805LD100KST-C-HF_C2921060.pdf; ComponentLink2Description: JLCPCB Part URL; ComponentLink2URL: https://jlcpcb.com/partdetail/C2921060; ComponentLink3Description: LCSC Part URL; ComponentLink3URL: https://lcsc.com/product-detail/Inductors-SMD_DDY-DDY-WI0805LD100KST-C-HF_C2921060.html
footprint IND-0805 (0805 (2012M) Inductor)
pins: 1, 2

## YWLD2012-1R0K
designator L?  Inductance: 1uH
Inductor, 1uH, ±10%, 169mΩ, 1.1A, SMD 0805; Manufacturer: YJYCOIN; Manufacturer Part Number: YWLD2012-1R0K; Self-Resonant Frequency: 208MHz; Q Factor: 14@7.9MHz; Package Size: 0805; JLCPCB Basic Part: No; JLCPCB Part Number: C5339212; Supplier 1: LCSC; Category: Inductors; Supplier Part Number 1: C5339212; Tolerance: ±10%; Rated Current: 1.1A; DC Resistance: 169mΩ; RoHS: Yes; ComponentLink1Description: Datasheet; ComponentLink1URL: https://wmsc.lcsc.com/wmsc/upload/file/pdf/v2/lcsc/2212271430_YJYCOIN-YWLD2012-1R0K_C5339212.pdf; ComponentLink2Description: JLCPCB Part URL; ComponentLink2URL: https://jlcpcb.com/partdetail/C5339212; ComponentLink3Description: LCSC Part URL; ComponentLink3URL: https://lcsc.com/product-detail/Inductors-SMD_YJYCOIN-YJYCOIN-YWLD2012-1R0K_C5339212.html
footprint IND-0805 (0805 (2012M) Inductor)
pins: 1, 2

## YWLD2012-1R2K
designator L?  Inductance: 1.2uH
Inductor, 1.2uH, ±10%, 0.169Ω, 960mA, SMD 0805; Manufacturer: YJYCOIN; Manufacturer Part Number: YWLD2012-1R2K; Self-Resonant Frequency: 208MHz; Package Size: 0805; JLCPCB Basic Part: No; JLCPCB Part Number: C5563768; Supplier 1: LCSC; Category: Inductors; Supplier Part Number 1: C5563768; Tolerance: ±10%; Rated Current: 960mA; DC Resistance: 0.169Ω; RoHS: Yes; ComponentLink1Description: Datasheet; ComponentLink1URL: https://wmsc.lcsc.com/wmsc/upload/file/pdf/v2/lcsc/2304271713_YJYCOIN-YWLD2012-1R2K_C5563768.pdf; ComponentLink2Description: JLCPCB Part URL; ComponentLink2URL: https://jlcpcb.com/partdetail/C5563768; ComponentLink3Description: LCSC Part URL; ComponentLink3URL: https://lcsc.com/product-detail/Inductors-SMD_YJYCOIN-YJYCOIN-YWLD2012-1R2K_C5563768.html
footprint IND-0805 (0805 (2012M) Inductor)
pins: 1, 2

## YWLD2012-8R2K
designator L?  Inductance: 8.2uH
Inductor, 8.2uH, ±10%, 940mΩ, 400mA, SMD 0805; Manufacturer: YJYCOIN; Manufacturer Part Number: YWLD2012-8R2K; Self-Resonant Frequency: 33MHz; Q Factor: 13@7.9MHz; Package Size: 0805; JLCPCB Basic Part: No; JLCPCB Part Number: C5563772; Supplier 1: LCSC; Category: Inductors; Supplier Part Number 1: C5563772; Tolerance: ±10%; Rated Current: 400mA; DC Resistance: 940mΩ; RoHS: Yes; ComponentLink1Description: Datasheet; ComponentLink1URL: https://wmsc.lcsc.com/wmsc/upload/file/pdf/v2/lcsc/2304271713_YJYCOIN-YWLD2012-8R2K_C5563772.pdf; ComponentLink2Description: JLCPCB Part URL; ComponentLink2URL: https://jlcpcb.com/partdetail/C5563772; ComponentLink3Description: LCSC Part URL; ComponentLink3URL: https://lcsc.com/product-detail/Inductors-SMD_YJYCOIN-YJYCOIN-YWLD2012-8R2K_C5563772.html
footprint IND-0805 (0805 (2012M) Inductor)
pins: 1, 2

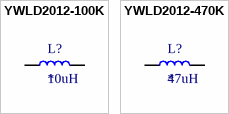
[diagram p22: symbols YWLD2012-100K to YWLD2012-470K]

## YWLD2012-100K
designator L?  Inductance: 10uH
Inductor, 10uH, ±10%, 1.17Ω, 300mA, SMD 0805; Manufacturer: YJYCOIN; Manufacturer Part Number: YWLD2012-100K; Self-Resonant Frequency: 25MHz; Q Factor: 14@2.5MHz; Package Size: 0805; JLCPCB Basic Part: No; JLCPCB Part Number: C5339217; Supplier 1: LCSC; Category: Inductors; Supplier Part Number 1: C5339217; Tolerance: ±10%; Rated Current: 300mA; DC Resistance: 1.17Ω; RoHS: Yes; ComponentLink1Description: Datasheet; ComponentLink1URL: https://wmsc.lcsc.com/wmsc/upload/file/pdf/v2/lcsc/2212271430_YJYCOIN-YWLD2012-100K_C5339217.pdf; ComponentLink2Description: JLCPCB Part URL; ComponentLink2URL: https://jlcpcb.com/partdetail/C5339217; ComponentLink3Description: LCSC Part URL; ComponentLink3URL: https://lcsc.com/product-detail/Inductors-SMD_YJYCOIN-YJYCOIN-YWLD2012-100K_C5339217.html
footprint IND-0805 (0805 (2012M) Inductor)
pins: 1, 2

## YWLD2012-470K
designator L?  Inductance: 47uH
Inductor, 47uH, ±10%, 4.42Ω, 160mA, SMD 0805; Manufacturer: YJYCOIN; Manufacturer Part Number: YWLD2012-470K; Self-Resonant Frequency: 15MHz; Q Factor: 14@2.5MHz; Package Size: 0805; JLCPCB Basic Part: No; JLCPCB Part Number: C5339221; Supplier 1: LCSC; Category: Inductors; Supplier Part Number 1: C5339221; Tolerance: ±10%; Rated Current: 160mA; DC Resistance: 4.42Ω; RoHS: Yes; ComponentLink1Description: Datasheet; ComponentLink1URL: https://wmsc.lcsc.com/wmsc/upload/file/pdf/v2/lcsc/2212271430_YJYCOIN-YWLD2012-470K_C5339221.pdf; ComponentLink2Description: JLCPCB Part URL; ComponentLink2URL: https://jlcpcb.com/partdetail/C5339221; ComponentLink3Description: LCSC Part URL; ComponentLink3URL: https://lcsc.com/product-detail/Inductors-SMD_YJYCOIN-YJYCOIN-YWLD2012-470K_C5339221.html
footprint IND-0805 (0805 (2012M) Inductor)
pins: 1, 2